# Altium footprint library Custom2.PcbLib: 99 footprints (part 4 of 7)
Each footprint in its own frame and in the unit in brackets; x right, y up, seen from the top. Pads: shape width x height; smd on the part's side, far side on the other; paste and mask are expansions set on the pad; w line width, h text height; cw(c..) or ccw(c..) is an arc to the next point about the centre after c.
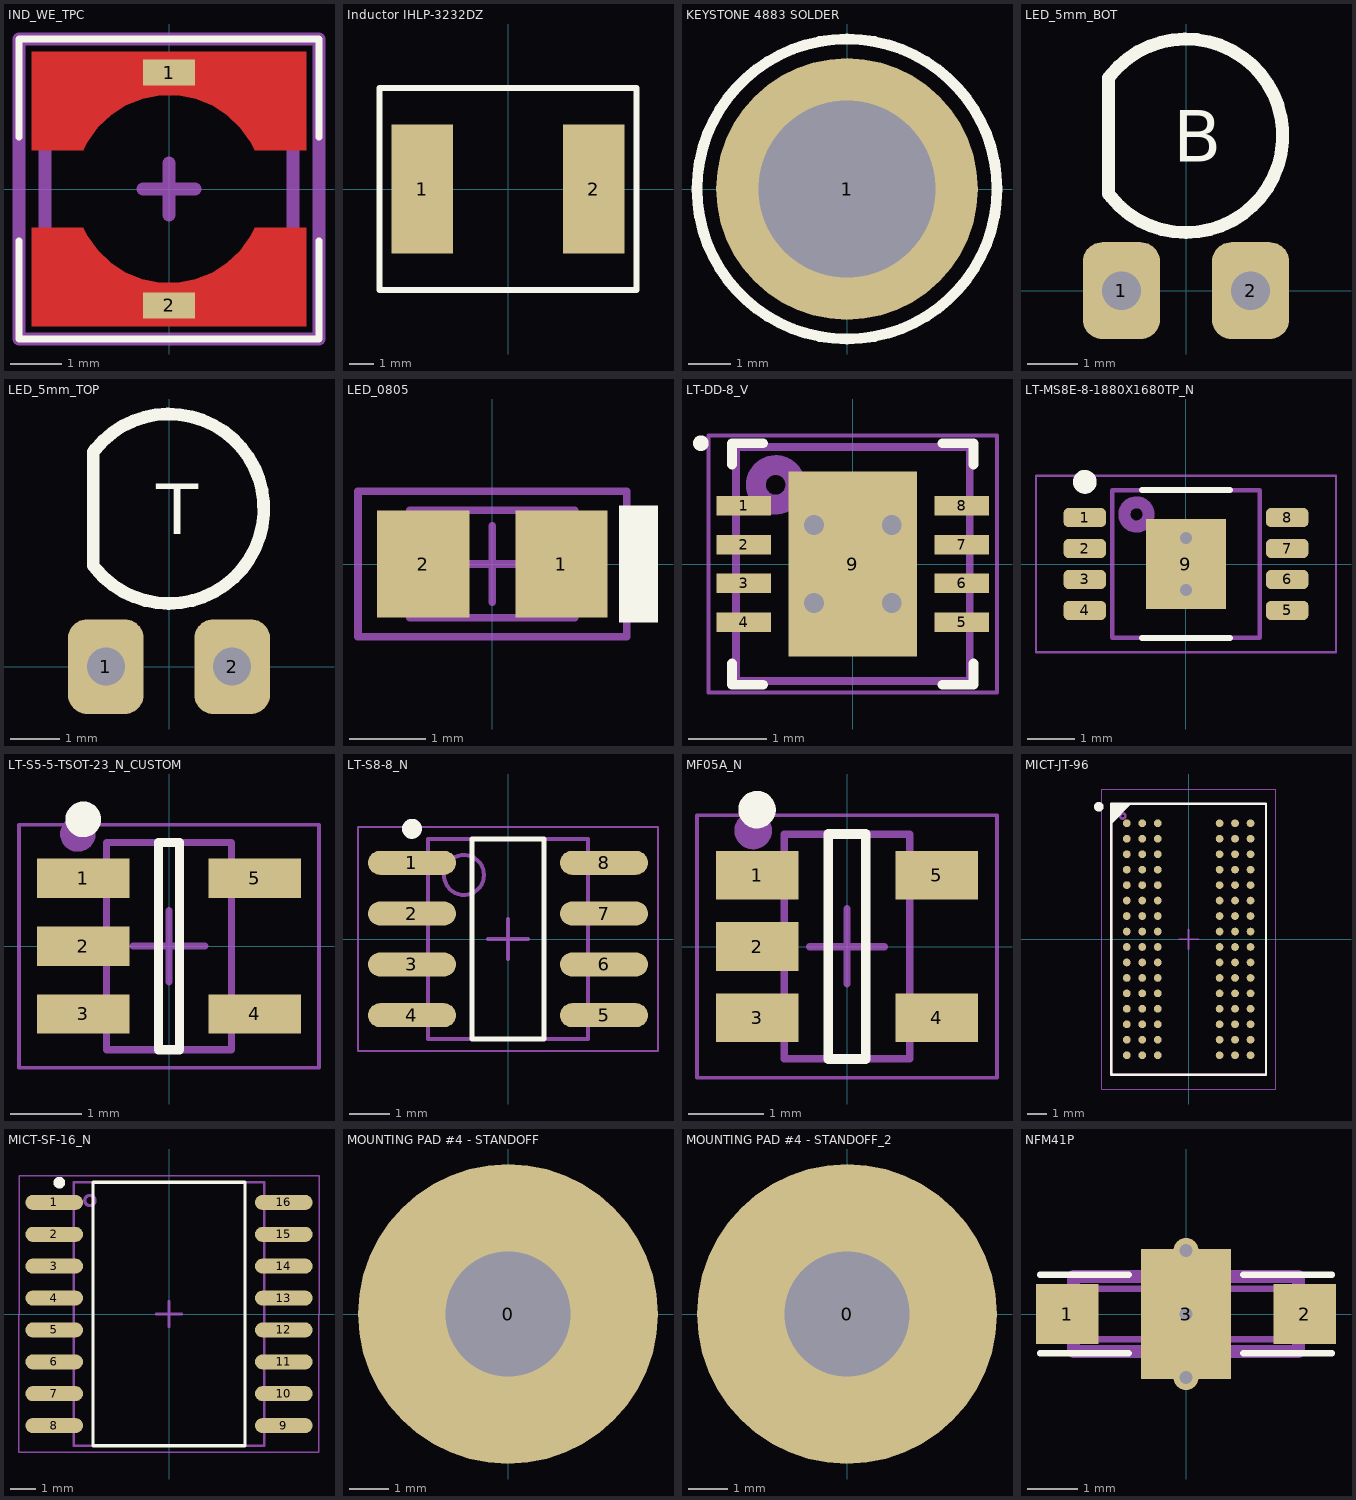
[diagram p3: the footprints below, top view; thin cyan lines are the x and y axes]

## IND_WE_TPC [mm]
pads (2):
  rect 1x0.5 smd: 1(0,2.25) 2(0,-2.25)
Top Layer:
  region: -2.65,0.75 -1.65,0.75 -1.656,0.753 -1.577,0.907 -1.376,1.19 -1.125,1.429 -0.834,1.617 -0.512,1.745 -0.172,1.811 0.175,1.811 0.515,1.745 0.837,1.615 1.128,1.427 1.378,1.187 1.578,0.904 1.657,0.75 2.65,0.75 2.65,2.65 -2.65,2.65
  region: 2.65,-0.75 1.65,-0.75 1.656,-0.753 1.577,-0.907 1.376,-1.19 1.125,-1.429 0.834,-1.617 0.512,-1.745 0.172,-1.811 -0.175,-1.811 -0.515,-1.745 -0.837,-1.615 -1.128,-1.427 -1.378,-1.187 -1.578,-0.904 -1.657,-0.75 -2.65,-0.75 -2.65,-2.65 2.65,-2.65
Top Overlay:
  lines w0.127: -2.9,-1 -2.9,-2.9 2.9,-2.9 2.9,-1 ; -2.9,1 -2.9,2.9 2.9,2.9 2.9,1
Mechanical 13:
  lines w0.254: -2.4,-2.4 2.4,-2.4 2.4,2.4 -2.4,2.4 -2.4,-2.4
  text "'.Designator'" at -1.657,-0.75 h0.76
Mechanical 15:
  lines w0.254: -0.5,0 0.5,0 ; 0,-0.5 0,0.5 ; -2.9,-2.9 -2.9,2.9 2.9,2.9 2.9,-2.9 -2.9,-2.9
3D body: height 2.8, standoff 0, extent -2.527,-2.527 2.527,2.527

## Inductor IHLP-3232DZ [mil]
pads (2):
  rect 100x210 smd: 1(-140,0) 2(140,0)
Top Overlay:
  lines w10: -210,165 -210,0 -210,-40 -210,-165 210,-165 210,165 -209.38,165

## KEYSTONE 4883 SOLDER [mm]
pads (1):
  round 6.2 hole 4.191 paste+0: 1(0,0)
Top Overlay:
  circle w0.254: c0,0 r3.556
Top Paste:
  lines w0.85: -2.263,-1.279 cw(c0,0) -2.238,1.323 ; -1.323,-2.238 ccw(c0,0) 1.279,-2.263 ; -1.279,2.263 cw(c0,0) 1.323,2.238 ; 2.238,-1.323 ccw(c0,0) 2.263,1.279
3D body "Keystone 4883.STEP": height 6.36, standoff -1.51, extent -2.781,-2.781 2.781,2.781

## LED_5mm_BOT [mil] "LED for PDOM CAL BRD TOP"
pads (2):
  rrect50% 60x75 hole 30: 1(-50,0) 2(50,0)
Top Overlay:
  lines w10: -60,75 -60,165 ; -58.57,166.85 cw(c0,120) -58.05,72.51
  text "B" at -10,100 h40
3D body "LED_Lower.STEP": height 261.8, standoff -20, extent -97,-9.48 114.61,455.48

## LED_5mm_TOP [mil] "LED for PDOM CAL BRD TOP"
pads (2):
  rrect50% 60x75 hole 30: 1(-50,0) 2(50,0)
Top Overlay:
  lines w10: -60,80 -60,170 ; -58.57,171.85 cw(c0,125) -58.05,77.51
  text "T" at -10,105 h40
3D body: height 244.09, standoff 32.48, extent -325,125 -325,125
3D body "LED_TOP.STEP": height 414.58, standoff -90, extent -97.62,-10.4 114,326.39

## LED_0805 [mm]
pads (2):
  rect 1.2x1.4 smd: 1(0.9,0) 2(-0.9,0)
Top Overlay:
  rectangle: 1.651,-0.762 2.159,0.762
Mechanical 13:
  rectangle: 0.559,-0.711 1.067,0.686
  lines w0.1: -1.075,-0.7 -1.075,0.7 1.075,0.7 1.075,-0.7 -1.075,-0.7
  text "'.Designator'" at 1.549,2.159 h0.76
Mechanical 15:
  lines w0.1: -0.5,0 0.5,0 ; 0,-0.5 0,0.5 ; -1.75,-0.95 -1.75,0.95 1.75,0.95 1.75,-0.95 -1.75,-0.95
3D body: height 0.25, standoff 0, extent 0.613,-0.622 0.713,0.622
3D body: height 0.8, standoff 0.25, extent -0.587,-0.525 0.588,0.525
3D body: height 0.25, standoff 0, extent 0.713,-0.622 1.013,0.622
3D body: height 0.25, standoff 0, extent -0.987,-0.622 -0.687,0.622
3D body: height 0.25, standoff 0, extent -0.687,-0.622 0.613,0.622

## LT-DD-8_V [mm]
pads (9):
  rect 0.7x0.25 smd mask+0.102: 1(-1.4,0.75) 2(-1.4,0.25) 3(-1.4,-0.25) 4(-1.4,-0.75) 5(1.4,-0.75) 6(1.4,-0.25) 7(1.4,0.25) 8(1.4,0.75)
  rect 1.65x2.38 smd mask+0.102: 9(0,0)
via 0.5,-0.5 diameter 0.508 hole 0.254
via -0.5,-0.5 diameter 0.508 hole 0.254
via 0.5,0.5 diameter 0.508 hole 0.254
via -0.5,0.5 diameter 0.508 hole 0.254
Top Overlay:
  circle w0.1: c-1.95,1.55 r0.05
  lines w0.127: -1.55,-1.275 -1.55,-1.55 -1.15,-1.55 ; -1.55,1.275 -1.55,1.55 -1.15,1.55 ; 1.15,-1.55 1.55,-1.55 1.55,-1.275 ; 1.15,1.55 1.55,1.55 1.55,1.275
Mechanical 13:
  circle w0.254: c-0.991,1.016 r0.254
  lines w0.1: -1.5,-1.5 1.5,-1.5 1.5,1.5 -1.5,1.5 -1.5,-1.5
  text "'.Designator'" at -1.263,-0.632 h0.76
Mechanical 15:
  lines w0.05: -1.85,-1.65 1.85,-1.65 1.85,1.65 -1.85,1.65 -1.85,-1.65
  lines w0.1: -0.5,0 0.5,0 ; 0,-0.5 0,0.5
3D body: height 0.8, standoff 0, extent -1.5,-1.5 1.5,1.5
3D body: height 0.84, standoff 0.81, extent -1.243,0.762 -0.737,1.27

## LT-MS8E-8-1880X1680TP_N [mm]
pads (9):
  rrect50% 0.89x0.4 smd mask+0.076: 1(-2.125,0.975) 2(-2.125,0.325) 3(-2.125,-0.325) 4(-2.125,-0.975) 5(2.125,-0.975) 6(2.125,-0.325) 7(2.125,0.325) 8(2.125,0.975)
  rect 1.68x1.88 smd paste-1.016: 9(0,0)
via 0,-0.55 diameter 0.508 hole 0.254
via 0,0.55 diameter 0.508 hole 0.254
Top Overlay:
  circle w0.25: c-2.125,1.725 r0.125
  lines w0.127: -0.925,-1.55 0.925,-1.55 ; -0.925,1.55 0.925,1.55
Top Paste:
  circle w0.381: c-0.525,0.625 r0.1
  circle w0.381: c-0.525,0 r0.1
  circle w0.381: c-0.525,-0.625 r0.1
  circle w0.381: c0.525,-0.625 r0.1
  circle w0.381: c0.525,0.625 r0.1
  circle w0.381: c0.525,0 r0.1
  rectangle: -0.525,-0.275 0.525,0.275
Mechanical 13:
  circle w0.254: c-1.041,1.041 r0.254
  lines w0.1: -1.55,-1.55 1.55,-1.55 1.55,1.55 -1.55,1.55 -1.55,-1.55
  text "'.Designator'" at -0.933,-0.86 h0.76
Mechanical 15:
  lines w0.05: -3.15,-1.85 3.15,-1.85 3.15,1.85 -3.15,1.85 -3.15,-1.85
  lines w0.1: -0.5,0 0.5,0 ; 0,-0.5 0,0.5
3D body: height 1.12, standoff 1.09, extent -1.295,0.813 -0.788,1.319
3D body: height 1.1, standoff 0.05, extent -1.55,-1.55 1.55,1.55

## LT-S5-5-TSOT-23_N_CUSTOM [mm]
pads (5):
  rect 1.3x0.55 smd: 1(-1.2,0.95) 2(-1.2,0) 3(-1.2,-0.95) 4(1.2,-0.95) 5(1.2,0.95)
Top Overlay:
  circle w0.25: c-1.2,1.775 r0.125
  lines w0.127: -0.15,-1.45 -0.15,1.45 0.15,1.45 0.15,-1.45 -0.15,-1.45
Mechanical 13:
  circle w0.25: c-1.276,1.572 r0.125
  lines w0.1: -0.875,-1.45 0.875,-1.45 0.875,1.45 -0.875,1.45 -0.875,-1.45
  text "'.Designator'" at 0.483,-1.092 h0.76
Mechanical 15:
  lines w0.05: -2.1,-1.7 2.1,-1.7 2.1,1.7 -2.1,1.7 -2.1,-1.7
  lines w0.1: -0.5,0 0.5,0 ; 0,-0.5 0,0.5
3D body: height 1.04, standoff 1.02, extent -0.761,0.838 -0.254,1.344
3D body: height 1.02, standoff 0, extent -0.875,-1.45 0.875,1.45

## LT-S8-8_N [mm]
pads (8):
  oval 2.2x0.6 smd: 1(-2.4,1.905) 2(-2.4,0.635) 3(-2.4,-0.635) 4(-2.4,-1.905) 5(2.4,-1.905) 6(2.4,-0.635) 7(2.4,0.635) 8(2.4,1.905)
Top Overlay:
  circle w0.25: c-2.4,2.755 r0.125
  lines w0.127: -0.9,-2.5 0.9,-2.5 0.9,2.5 -0.9,2.5 -0.9,-2.5
Mechanical 13:
  circle w0.1: c-1.1,1.6 r0.5
  lines w0.1: -2,-2.5 2,-2.5 2,2.5 -2,2.5 -2,-2.5
  text "'.Designator'" at 0.787,-0.025 h0.76
Mechanical 15:
  lines w0.05: -3.75,-2.8 3.75,-2.8 3.75,2.8 -3.75,2.8 -3.75,-2.8
  lines w0.1: -0.5,0 0.5,0 ; 0,-0.5 0,0.5
3D body: height 1.04, standoff 1.02, extent -1.65,1.702 -1.143,2.208
3D body: height 1.02, standoff 0, extent -2,-2.5 2,2.5

## MF05A_N [mm]
pads (5):
  rect 1.1x0.65 smd: 1(-1.2,0.95) 2(-1.2,0) 3(-1.2,-0.95) 4(1.2,-0.95) 5(1.2,0.95)
Top Overlay:
  circle w0.25: c-1.2,1.825 r0.125
  lines w0.127: -0.25,-1.5 0.25,-1.5 0.25,1.5 -0.25,1.5 -0.25,-1.5
Mechanical 13:
  circle w0.25: c-1.251,1.546 r0.125
  lines w0.1: -0.835,-1.495 -0.835,1.495 0.835,1.495 0.835,-1.495 -0.835,-1.495
  text "'.Designator'" at -0.508,1.194 h0.76
Mechanical 15:
  lines w0.05: -2,-1.75 -2,1.75 2,1.75 2,-1.75 -2,-1.75
  lines w0.1: -0.5,0 0.5,0 ; 0,-0.5 0,0.5
3D body "SOT23-5.STEP": height 1.45, standoff 0, extent -1.4,-1.45 1.4,1.45

## MICT-JT-96 [mm]
pads (96):
  round 0.4 smd: A1(-3.2,6) A2(-2.4,6) A3(-1.6,6) A7(1.6,6) A8(2.4,6) A9(3.2,6) B1(-3.2,5.2) B2(-2.4,5.2) B3(-1.6,5.2) B7(1.6,5.2) B8(2.4,5.2) B9(3.2,5.2) C1(-3.2,4.4) C2(-2.4,4.4) C3(-1.6,4.4) C7(1.6,4.4) C8(2.4,4.4) C9(3.2,4.4) D1(-3.2,3.6) D2(-2.4,3.6) D3(-1.6,3.6) D7(1.6,3.6) D8(2.4,3.6) D9(3.2,3.6) E1(-3.2,2.8) E2(-2.4,2.8) E3(-1.6,2.8) E7(1.6,2.8) E8(2.4,2.8) E9(3.2,2.8) F1(-3.2,2) F2(-2.4,2) F3(-1.6,2) F7(1.6,2) F8(2.4,2) F9(3.2,2) G1(-3.2,1.2) G2(-2.4,1.2) G3(-1.6,1.2) G7(1.6,1.2) G8(2.4,1.2) G9(3.2,1.2) H1(-3.2,0.4) H2(-2.4,0.4) H3(-1.6,0.4) H7(1.6,0.4) H8(2.4,0.4) H9(3.2,0.4) J1(-3.2,-0.4) J2(-2.4,-0.4) J3(-1.6,-0.4) J7(1.6,-0.4) J8(2.4,-0.4) J9(3.2,-0.4) K1(-3.2,-1.2) K2(-2.4,-1.2) K3(-1.6,-1.2) K7(1.6,-1.2) K8(2.4,-1.2) K9(3.2,-1.2) L1(-3.2,-2) L2(-2.4,-2) L3(-1.6,-2) L7(1.6,-2) L8(2.4,-2) L9(3.2,-2) M1(-3.2,-2.8) M2(-2.4,-2.8) M3(-1.6,-2.8) M7(1.6,-2.8) M8(2.4,-2.8) M9(3.2,-2.8) N1(-3.2,-3.6) N2(-2.4,-3.6) N3(-1.6,-3.6) N7(1.6,-3.6) N8(2.4,-3.6) N9(3.2,-3.6) P1(-3.2,-4.4) P2(-2.4,-4.4) P3(-1.6,-4.4) P7(1.6,-4.4) P8(2.4,-4.4) P9(3.2,-4.4) R1(-3.2,-5.2) R2(-2.4,-5.2) R3(-1.6,-5.2) R7(1.6,-5.2) R8(2.4,-5.2) R9(3.2,-5.2) T1(-3.2,-6) T2(-2.4,-6) T3(-1.6,-6) T7(1.6,-6) T8(2.4,-6) T9(3.2,-6)
Top Overlay:
  circle w0.25: c-4.65,6.85 r0.125
  region: -3.049,7 -4,6.049 -4,7
  lines w0.127: -4,6.049 -3.049,7 ; -4,-7 4,-7 4,7 -4,7 -4,-7
Mechanical 13:
  circle w0.127: c-3.404,6.375 r0.137
  lines w0.1: -4,-7 4,-7 4,7 -4,7 -4,-7
  text "'.Designator'" at 0.701,0.246 h0.76
Mechanical 15:
  lines w0.05: -4.5,-7.747 4.5,-7.747 4.5,7.772 -4.5,7.772 -4.5,-7.747
  lines w0.1: -0.5,0 0.5,0 ; 0,-0.5 0,0.5
3D body: height 1.22, standoff 1.19, extent -3.984,6.122 -2.972,7.136
3D body: height 1.2, standoff 0.25, extent -4.5,-7.75 4.5,7.75

## MICT-SF-16_N [mm]
pads (16):
  oval 2.3x0.6 smd: 1(-4.575,4.445) 2(-4.575,3.175) 3(-4.575,1.905) 4(-4.575,0.635) 5(-4.575,-0.635) 6(-4.575,-1.905) 7(-4.575,-3.175) 8(-4.575,-4.445) 9(4.575,-4.445) 10(4.575,-3.175) 11(4.575,-1.905) 12(4.575,-0.635) 13(4.575,0.635) 14(4.575,1.905) 15(4.575,3.175) 16(4.575,4.445)
Top Overlay:
  circle w0.254: c-4.369,5.232 r0.105
  lines w0.127: -3.025,-5.25 -3.025,5.25 3.025,5.25 3.025,-5.25 -3.025,-5.25
Mechanical 13:
  circle w0.127: c-3.15,4.521 r0.205
  lines w0.1: -3.8,-5.25 -3.8,5.25 3.8,5.25 3.8,-5.25 -3.8,-5.25
  text "'.Designator'" at -0.635,2.769 h0.76
Mechanical 15:
  lines w0.05: -5.975,-5.5 -5.975,5.5 5.975,5.5 5.975,-5.5 -5.975,-5.5
  lines w0.1: -0.5,0 0.5,0 ; 0,-0.5 0,0.5
3D body: height 1.02, standoff 0, extent -3.8,-5.25 3.8,5.25
3D body: height 1.04, standoff 1.02, extent -3.177,3.713 -2.165,4.727

## MOUNTING PAD #4 - STANDOFF [mm]
pads (1):
  round 7.62 / inner round 5.08 / far side round 7.62 hole 3.175 paste-3.175: 0(0,0)

## MOUNTING PAD #4 - STANDOFF_2 [mm]
pads (1):
  round 7.62 / inner round 5.08 / far side round 7.62 hole 3.175 paste-3.175: 0(0,0)

## NFM41P [mm]
pads (3):
  rect 1.25x1.2 smd: 1(-2.375,0) 2(2.375,0)
  rect 1.8x2.6 smd paste-1.524: 3(0,0)
via 0,-1.27 diameter 0.508 hole 0.254
via 0,1.27 diameter 0.508 hole 0.254
via 0,0 diameter 0.508 hole 0.254
Top Overlay:
  lines w0.127: -2.921,-0.787 -1.143,-0.787 ; -2.921,0.787 -1.143,0.787 ; 1.143,-0.787 2.921,-0.787 ; 1.143,0.787 2.921,0.787
Top Paste:
  rectangle: 0.375,-0.4 0.8,0.4
  rectangle: -0.8,-0.4 -0.375,0.4
  rectangle: -0.875,-1.025 0.875,-0.225
  rectangle: -0.875,0.25 0.875,1.05
Mechanical 13:
  lines w0.127: -2.261,-0.508 2.235,-0.508 2.235,0.508 -2.261,0.508 -2.261,-0.508
  text "'.Designator'" at 1.397,1.93 h0.76
Mechanical 15:
  lines w0.254: -2.25,-0.75 2.25,-0.75 2.25,0.75 -2.25,0.75 -2.25,-0.75
3D body: height 1.3, standoff 0, extent -2.25,-0.508 2.25,0.5